# Altium footprint library Connectors THD.PcbLib: 631 footprints (part 7 of 46)
Each footprint in its own frame and in the unit in brackets; x right, y up, seen from the top. Pads: shape width x height; smd on the part's side, far side on the other; paste and mask are expansions set on the pad; w line width, h text height; cw(c..) or ccw(c..) is an arc to the next point about the centre after c.
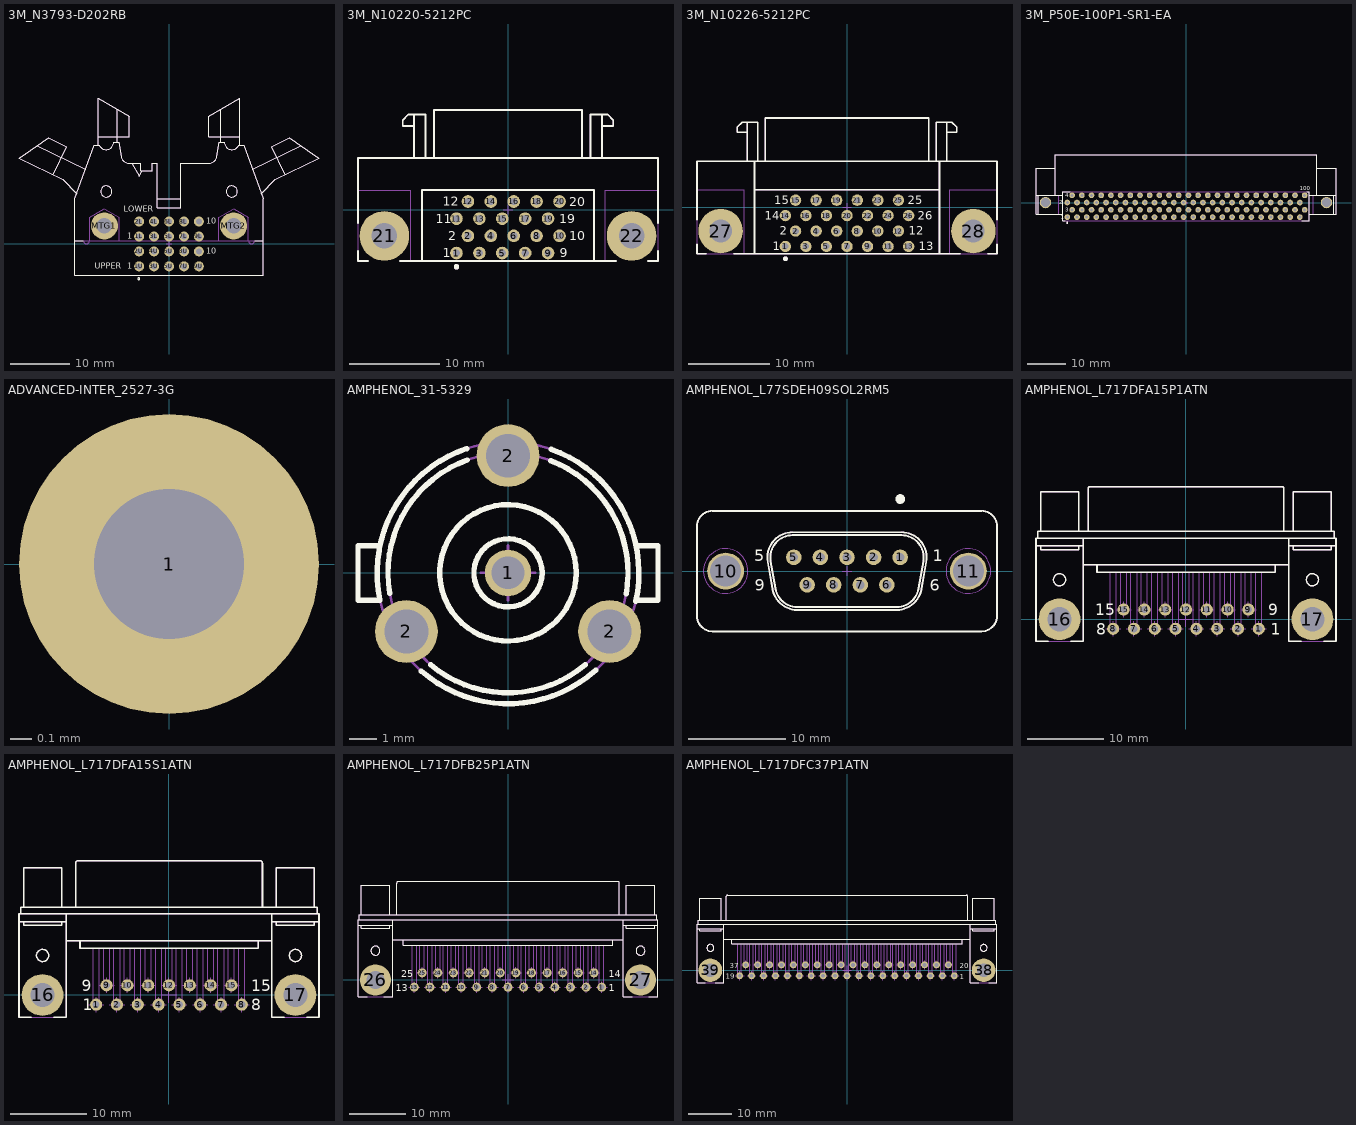
[diagram p6: the footprints below, top view; thin cyan lines are the x and y axes]

## 3M_N3793-D202RB [mm] "3M, 3000 Series, 2x10 Contacts - Pitch 2.54mm - Right Angle Four-Wall Condo Header (Black) With Short Roll Pin Latch/Ejectors"
height 15.5
pads (22):
  round 1.7 hole 1: 1L(-5.08,1.27) 1U(-5.08,-3.81) 2L(-5.08,3.81) 2U(-5.08,-1.27) 3L(-2.54,1.27) 3U(-2.54,-3.81) 4L(-2.54,3.81) 4U(-2.54,-1.27) 5L(0,1.27) 5U(0,-3.81) 6L(0,3.81) 6U(0,-1.27) 7L(2.54,1.27) 7U(2.54,-3.81) 8L(2.54,3.81) 8U(2.54,-1.27) 9L(5.08,1.27) 9U(5.08,-3.81) 10L(5.08,3.81) 10U(5.08,-1.27)
  round 4.6 hole 2.6: MTG1(-10.985,3.073) MTG2(10.985,3.073)
Top Overlay:
  circle w0.2: c-5.153,-5.913 r0.15
  circle w0.2: c10.668,8.915 r0.953
  circle w0.2: c-10.668,8.915 r0.953
  lines w0.2: -22.423,16.687 -14.159,12.71 ; -19.64,11.768 -17.36,16.505 -20.484,18.009 -25.5,14.588 -18.069,11.011 -15.671,8.554 ; -11.989,16.789 -11.989,24.74 -6.731,21.704 -6.731,18.237 -11.989,18.237 ; -8.763,17.297 -8.763,22.877 ; -6.829,13.741 -4.763,13.741 ; -6.318,13.741 -5.048,11.542 -4.511,12.471 ; -2.858,13.741 -2.032,13.741 ; -2.851,13.741 -2.851,12.471 -4.769,12.471 -4.769,13.741 -6.794,13.741 cw(c-6.829,15.053) -8.126,14.859 -8.556,17.297 -9.398,17.297 cw(c-10.668,17.297) -11.832,16.789 -12.674,16.789 -16.002,7.645 -16.002,-5.309 16.002,-5.309 16.002,7.645 12.674,16.789 11.832,16.789 cw(c10.668,17.297) 9.398,17.297 8.556,17.297 8.126,14.859 cw(c6.829,15.053) 6.794,13.741 2.032,13.741 ; 8.763,17.297 8.763,22.877 ; 11.989,16.789 11.989,24.74 6.731,21.704 6.731,18.237 11.989,18.237 ; 14.159,12.71 22.423,16.687 ; 15.671,8.554 18.069,11.011 25.5,14.588 20.484,18.009 17.36,16.505 19.64,11.768 ; -2.032,6.121 2.032,6.121 ; -2.032,6.121 -2.032,13.741 ; -2.032,6.121 -2.032,13.741 ; -2.032,6.121 2.032,6.121 ; 2.032,6.121 2.032,13.741 ; 2.032,6.121 2.032,13.741 ; -16.002,0.533 -14.542,0.533 -16.002,0.533 ; -2.032,7.645 2.032,7.645 -2.032,7.645 ; 14.542,0.533 16.002,0.533 14.542,0.533
  text "10" at 6.34,3.429 h1.02
  text "10" at 6.34,-1.651 h1.02
  text "UPPER" at -12.59,-4.25 h1
  text "1" at -7.112,-4.24 h1.02
  text "LOWER" at -7.685,5.465 h1
  text "1" at -7.112,0.84 h1.02
Mechanical 8:
  lines w0.1: -5.58,-3.81 -5.08,-3.81 ; -5.58,-1.27 -5.08,-1.27 ; -5.58,1.27 -5.08,1.27 ; -5.58,3.81 -5.08,3.81 ; -5.08,-4.31 -5.08,-3.81 ; -5.08,-3.31 -5.08,-3.81 ; -5.08,-1.77 -5.08,-1.27 ; -5.08,-0.77 -5.08,-1.27 ; -5.08,0.77 -5.08,1.27 ; -5.08,1.77 -5.08,1.27 ; -5.08,3.31 -5.08,3.81 ; -5.08,4.31 -5.08,3.81 ; -4.58,-3.81 -5.08,-3.81 ; -4.58,-1.27 -5.08,-1.27 ; -4.58,1.27 -5.08,1.27 ; -4.58,3.81 -5.08,3.81 ; -3.04,-3.81 -2.54,-3.81 ; -3.04,-1.27 -2.54,-1.27 ; -3.04,1.27 -2.54,1.27 ; -3.04,3.81 -2.54,3.81 ; -2.54,-4.31 -2.54,-3.81 ; -2.54,-3.31 -2.54,-3.81 ; -2.54,-1.77 -2.54,-1.27 ; -2.54,-0.77 -2.54,-1.27 ; -2.54,0.77 -2.54,1.27 ; -2.54,1.77 -2.54,1.27 ; -2.54,3.31 -2.54,3.81 ; -2.54,4.31 -2.54,3.81 ; -2.04,-3.81 -2.54,-3.81 ; -2.04,-1.27 -2.54,-1.27 ; -2.04,1.27 -2.54,1.27 ; -2.04,3.81 -2.54,3.81 ; -0.5,-3.81 0,-3.81 ; -0.5,-1.27 0,-1.27 ; -0.5,1.27 0,1.27 ; -0.5,3.81 0,3.81 ; 0,-4.31 0,-3.81 ; 0,-3.31 0,-3.81 ; 0,-1.77 0,-1.27 ; 0,-0.77 0,-1.27 ; 0,0.77 0,1.27 ; 0,1.77 0,1.27 ; 0,3.31 0,3.81 ; 0,4.31 0,3.81 ; 0.5,-3.81 0,-3.81 ; 0.5,-1.27 0,-1.27 ; 0.5,1.27 0,1.27 ; 0.5,3.81 0,3.81 ; 2.04,-3.81 2.54,-3.81 ; 2.04,-1.27 2.54,-1.27 ; 2.04,1.27 2.54,1.27 ; 2.04,3.81 2.54,3.81 ; 2.54,-4.31 2.54,-3.81 ; 2.54,-3.31 2.54,-3.81 ; 2.54,-1.77 2.54,-1.27 ; 2.54,-0.77 2.54,-1.27 ; 2.54,0.77 2.54,1.27 ; 2.54,1.77 2.54,1.27 ; 2.54,3.31 2.54,3.81 ; 2.54,4.31 2.54,3.81 ; 3.04,-3.81 2.54,-3.81 ; 3.04,-1.27 2.54,-1.27 ; 3.04,1.27 2.54,1.27 ; 3.04,3.81 2.54,3.81 ; 4.58,-3.81 5.08,-3.81 ; 4.58,-1.27 5.08,-1.27 ; 4.58,1.27 5.08,1.27 ; 4.58,3.81 5.08,3.81 ; 5.08,-4.31 5.08,-3.81 ; 5.08,-3.31 5.08,-3.81 ; 5.08,-1.77 5.08,-1.27 ; 5.08,-0.77 5.08,-1.27 ; 5.08,0.77 5.08,1.27 ; 5.08,1.77 5.08,1.27 ; 5.08,3.31 5.08,3.81 ; 5.08,4.31 5.08,3.81 ; 5.58,-3.81 5.08,-3.81 ; 5.58,-1.27 5.08,-1.27 ; 5.58,1.27 5.08,1.27 ; 5.58,3.81 5.08,3.81 ; 10.486,3.073 10.986,3.073 ; 10.986,2.573 10.986,3.073 ; 10.986,3.573 10.986,3.073 ; 11.486,3.073 10.986,3.073 ; 0,0 -0.5,0 0,0 ; 0,0 0,-0.5 0,0 ; 0,0 0.5,0 0,0 ; 0,0 0,0.5 0,0
Mechanical 14:
  circle w0.1: c10.668,8.915 r0.953
  circle w0.1: c-10.668,8.915 r0.953
  circle w0.1: c10.986,3.073 r1.27
  circle w0.1: c-10.986,3.073 r1.27
  lines w0.1: -22.423,16.687 -14.159,12.71 ; -19.64,11.768 -17.36,16.505 -20.484,18.009 -25.5,14.588 -18.069,11.011 -15.671,8.554 ; -11.989,16.789 -11.989,24.74 -6.731,21.704 -6.731,18.237 -11.989,18.237 ; -8.763,17.297 -8.763,22.877 ; -8.484,0.533 -8.484,4.518 -10.986,5.962 -13.487,4.518 -13.487,0.533 -13.526,0.533 cw(c-14.034,0.533) -14.542,0.533 -16.002,0.533 16.002,0.533 14.542,0.533 cw(c14.034,0.533) 13.526,0.533 13.487,0.533 13.487,4.518 10.986,5.962 8.484,4.518 8.484,0.533 ; -6.829,13.741 -4.763,13.741 ; -6.318,13.741 -5.048,11.542 -4.511,12.471 ; -2.858,13.741 -2.032,13.741 ; -2.851,13.741 -2.851,12.471 -4.769,12.471 -4.769,13.741 -6.794,13.741 cw(c-6.829,15.053) -8.126,14.859 -8.556,17.297 -9.398,17.297 cw(c-10.668,17.297) -11.832,16.789 -12.674,16.789 -16.002,7.645 -16.002,-5.309 16.002,-5.309 16.002,7.645 12.674,16.789 11.832,16.789 cw(c10.668,17.297) 9.398,17.297 8.556,17.297 8.126,14.859 cw(c6.829,15.053) 6.794,13.741 2.032,13.741 ; 8.763,17.297 8.763,22.877 ; 11.989,16.789 11.989,24.74 6.731,21.704 6.731,18.237 11.989,18.237 ; 14.159,12.71 22.423,16.687 ; 15.671,8.554 18.069,11.011 25.5,14.588 20.484,18.009 17.36,16.505 19.64,11.768 ; -2.032,6.121 2.032,6.121 ; -2.032,6.121 -2.032,13.741 ; -2.032,6.121 -2.032,13.741 ; -2.032,6.121 2.032,6.121 ; 2.032,6.121 2.032,13.741 ; 2.032,6.121 2.032,13.741 ; -2.032,7.645 2.032,7.645 -2.032,7.645
  text "10" at 6.34,-1.651 h1.02
  text "10" at 6.34,3.429 h1.02
  text "UPPER" at -12.59,-4.25 h1
  text "1" at -7.112,-4.24 h1.02
  text "LOWER" at -7.685,5.465 h1
  text "1" at -7.112,0.84 h1.02
3D body: height 15.49, standoff -3.81, extent -25.398,-5.309 25.398,18.009

## 3M_N10220-5212PC [mm] "20 contacts, Mini D Ribbon (MDR), 102 Series, .050\" Boardmount Through-hole Right Angle Receptacle-Shielded"
height 9.4
pads (22):
  round 1.4 hole 0.8: 1(-5.715,-4.826) 2(-4.445,-2.921) 3(-3.175,-4.826) 4(-1.905,-2.921) 5(-0.635,-4.826) 6(0.635,-2.921) 7(1.905,-4.826) 8(3.175,-2.921) 9(4.445,-4.826) 10(5.715,-2.921) 11(-5.715,-1.016) 12(-4.445,0.889) 13(-3.175,-1.016) 14(-1.905,0.889) 15(-0.635,-1.016) 16(0.635,0.889) 17(1.905,-1.016) 18(3.175,0.889) 19(4.445,-1.016) 20(5.715,0.889)
  round 5.5 hole 2.8: 21(-13.716,-2.921) 22(13.716,-2.921)
Top Overlay:
  circle w0.3: c-5.715,-6.35 r0.15
  lines w0.2: -16.637,-4.578 -16.637,-5.715 -15.5,-5.715 ; -16.637,-1.5 -16.637,5.715 16.637,5.715 16.637,-1.5 ; -12,-5.715 12,-5.715 ; -10.414,5.715 -10.414,10.541 ; -10.414,9.271 -11.684,9.271 -11.684,9.906 -11.049,10.541 -10.414,10.541 ; -9.525,-5.715 -9.525,2.159 9.525,2.159 9.525,-5.715 ; -9.144,5.715 -9.144,10.541 -10.414,10.541 ; -8.212,5.715 -8.212,11.049 8.212,11.049 8.212,5.715 ; 9.144,5.715 9.144,10.541 10.414,10.541 ; 10.414,5.715 10.414,10.541 ; 10.414,9.271 11.684,9.271 11.684,9.906 11.049,10.541 10.414,10.541 ; 15.5,-5.715 16.637,-5.715 16.637,-4.578
  text "1" at -7.225,-5.31 h1.02
  text "2" at -6.605,-3.405 h1.02
  text "12" at -7.255,0.405 h1.02
  text "11" at -8.025,-1.5 h1.02
  text "19" at 5.705,-1.505 h1.02
  text "9" at 5.727,-5.293 h1.02
  text "10" at 6.8,-3.435 h1.02
  text "20" at 6.8,0.375 h1.02
Mechanical 8:
  lines w0.1: -14.216,-2.921 -13.716,-2.921 ; -13.716,-3.421 -13.716,-2.921 ; -13.716,-2.421 -13.716,-2.921 ; -13.216,-2.921 -13.716,-2.921 ; -6.215,-4.826 -5.715,-4.826 ; -6.215,-1.016 -5.715,-1.016 ; -5.715,-5.326 -5.715,-4.826 ; -5.715,-4.326 -5.715,-4.826 ; -5.215,-4.826 -5.715,-4.826 ; -5.215,-1.016 -5.715,-1.016 ; -4.945,-2.921 -4.445,-2.921 ; -4.945,0.889 -4.445,0.889 ; -4.445,-3.421 -4.445,-2.921 ; -4.445,-2.421 -4.445,-2.921 ; -4.445,0.389 -4.445,0.889 ; -4.445,1.389 -4.445,0.889 ; -3.945,-2.921 -4.445,-2.921 ; -3.945,0.889 -4.445,0.889 ; -3.675,-4.826 -3.175,-4.826 ; -3.675,-1.016 -3.175,-1.016 ; -3.175,-5.326 -3.175,-4.826 ; -3.175,-4.326 -3.175,-4.826 ; -2.675,-4.826 -3.175,-4.826 ; -2.675,-1.016 -3.175,-1.016 ; -2.405,-2.921 -1.905,-2.921 ; -2.405,0.889 -1.905,0.889 ; -1.905,-3.421 -1.905,-2.921 ; -1.905,-2.421 -1.905,-2.921 ; -1.905,0.389 -1.905,0.889 ; -1.905,1.389 -1.905,0.889 ; -1.405,-2.921 -1.905,-2.921 ; -1.405,0.889 -1.905,0.889 ; -1.135,-4.826 -0.635,-4.826 ; -1.135,-1.016 -0.635,-1.016 ; -0.635,-5.326 -0.635,-4.826 ; -0.635,-4.326 -0.635,-4.826 ; -0.5,0 0,0 ; -0.135,-4.826 -0.635,-4.826 ; -0.135,-1.016 -0.635,-1.016 ; 0.135,-2.921 0.635,-2.921 ; 0.135,0.889 0.635,0.889 ; 0.5,0 0,0 ; 0.635,-3.421 0.635,-2.921 ; 0.635,-2.421 0.635,-2.921 ; 0.635,0.389 0.635,0.889 ; 0.635,1.389 0.635,0.889 ; 1.135,-2.921 0.635,-2.921 ; 1.135,0.889 0.635,0.889 ; 1.405,-4.826 1.905,-4.826 ; 1.405,-1.016 1.905,-1.016 ; 1.905,-5.326 1.905,-4.826 ; 1.905,-4.326 1.905,-4.826 ; 2.405,-4.826 1.905,-4.826 ; 2.405,-1.016 1.905,-1.016 ; 2.675,-2.921 3.175,-2.921 ; 2.675,0.889 3.175,0.889 ; 3.175,-3.421 3.175,-2.921 ; 3.175,-2.421 3.175,-2.921 ; 3.175,0.389 3.175,0.889 ; 3.175,1.389 3.175,0.889 ; 3.675,-2.921 3.175,-2.921 ; 3.675,0.889 3.175,0.889 ; 3.945,-4.826 4.445,-4.826 ; 3.945,-1.016 4.445,-1.016 ; 4.445,-5.326 4.445,-4.826 ; 4.445,-4.326 4.445,-4.826 ; 4.945,-4.826 4.445,-4.826 ; 4.945,-1.016 4.445,-1.016 ; 5.215,-2.921 5.715,-2.921 ; 5.215,0.889 5.715,0.889 ; 5.715,-3.421 5.715,-2.921 ; 5.715,-2.421 5.715,-2.921 ; 5.715,0.389 5.715,0.889 ; 5.715,1.389 5.715,0.889 ; 6.215,-2.921 5.715,-2.921 ; 6.215,0.889 5.715,0.889 ; 13.216,-2.921 13.716,-2.921 ; 13.716,-3.421 13.716,-2.921 ; 13.716,-2.421 13.716,-2.921 ; 14.216,-2.921 13.716,-2.921 ; -5.715,-1.016 -5.715,-0.516 -5.715,-1.016 ; -5.715,-1.016 -5.715,-1.516 -5.715,-1.016 ; -3.175,-1.016 -3.175,-0.516 -3.175,-1.016 ; -3.175,-1.016 -3.175,-1.516 -3.175,-1.016 ; -0.635,-1.016 -0.635,-0.516 -0.635,-1.016 ; -0.635,-1.016 -0.635,-1.516 -0.635,-1.016 ; 0,0 0,0.5 0,0 ; 0,0 0,-0.5 0,0 ; 1.905,-1.016 1.905,-0.516 1.905,-1.016 ; 1.905,-1.016 1.905,-1.516 1.905,-1.016 ; 4.445,-1.016 4.445,-0.516 4.445,-1.016 ; 4.445,-1.016 4.445,-1.516 4.445,-1.016
Mechanical 14:
  circle w0.1: c-13.716,-2.921 r1.245
  circle w0.1: c13.716,-2.921 r1.245
  circle w0.3: c-5.715,-6.35 r0.15
  lines w0.1: -16.637,-5.715 -16.637,5.715 16.637,5.715 16.637,-5.715 ; -16.637,2.159 -10.795,2.159 -10.795,-5.715 ; -13.97,-4.139 -13.97,-5.099 -13.462,-5.099 -13.462,-4.139 ; -13.97,-1.703 -13.97,-0.743 -13.462,-0.743 -13.462,-1.703 ; -10.414,5.715 -10.414,10.541 ; -10.414,9.271 -11.684,9.271 -11.684,9.906 -11.049,10.541 -10.414,10.541 ; -9.525,-5.715 -9.525,2.159 9.525,2.159 9.525,-5.715 ; -9.144,5.715 -9.144,10.541 -10.414,10.541 ; -8.212,5.715 -8.212,11.049 8.212,11.049 8.212,5.715 ; 9.144,5.715 9.144,10.541 10.414,10.541 ; 10.414,5.715 10.414,10.541 ; 10.414,9.271 11.684,9.271 11.684,9.906 11.049,10.541 10.414,10.541 ; 10.795,-5.715 10.795,2.159 16.637,2.159 ; 13.462,-4.139 13.462,-5.099 13.97,-5.099 13.97,-4.139 ; 13.462,-1.703 13.462,-0.743 13.97,-0.743 13.97,-1.703
  text "1" at -7.225,-5.31 h1.02
  text "2" at -6.605,-3.405 h1.02
  text "12" at -7.255,0.405 h1.02
  text "11" at -8.025,-1.5 h1.02
  text "19" at 5.705,-1.505 h1.02
  text "9" at 5.727,-5.293 h1.02
  text "10" at 6.8,-3.435 h1.02
  text "20" at 6.8,0.375 h1.02
3D body: height 9.4, standoff -3.81, extent -16.637,-5.715 16.637,11.049

## 3M_N10226-5212PC [mm] "26 contacts, Mini D Ribbon (MDR), 102 Series, .050\" Boardmount Through-hole Right Angle Receptacle-Shielded"
height 9.4
pads (28):
  round 1.4 hole 0.8: 1(-7.62,-4.826) 2(-6.35,-2.921) 3(-5.08,-4.826) 4(-3.81,-2.921) 5(-2.54,-4.826) 6(-1.27,-2.921) 7(0,-4.826) 8(1.27,-2.921) 9(2.54,-4.826) 10(3.81,-2.921) 11(5.08,-4.826) 12(6.35,-2.921) 13(7.62,-4.826) 14(-7.62,-1.016) 15(-6.35,0.889) 16(-5.08,-1.016) 17(-3.81,0.889) 18(-2.54,-1.016) 19(-1.27,0.889) 20(0,-1.016) 21(1.27,0.889) 22(2.54,-1.016) 23(3.81,0.889) 24(5.08,-1.016) 25(6.35,0.889) 26(7.62,-1.016)
  round 5.5 hole 2.8: 27(-15.621,-2.921) 28(15.621,-2.921)
Top Overlay:
  circle w0.3: c-7.62,-6.35 r0.15
  lines w0.2: -18.542,-4.578 -18.542,-5.715 -17.405,-5.715 ; -18.542,-1.5 -18.542,5.715 18.542,5.715 18.542,-1.5 ; -14,-5.715 14,-5.715 ; -12.319,5.715 -12.319,10.541 ; -12.319,9.271 -13.589,9.271 -13.589,9.906 -12.954,10.541 -12.319,10.541 ; -11.43,-5.715 -11.43,5.715 ; -11.43,2.159 11.43,2.159 ; -11.049,5.715 -11.049,10.541 -12.319,10.541 ; -10.1,5.715 -10.1,11.049 10.1,11.049 10.1,5.715 ; 11.049,5.715 11.049,10.541 12.319,10.541 ; 11.43,-5.715 11.43,5.715 ; 12.319,5.715 12.319,10.541 ; 12.319,9.271 13.589,9.271 13.589,9.906 12.954,10.541 12.319,10.541 ; 17.405,-5.715 18.542,-5.715 18.542,-4.578
  text "1" at -9.19,-5.31 h1.02
  text "2" at -8.32,-3.405 h1.02
  text "15" at -9.02,0.405 h1.02
  text "14" at -10.14,-1.5 h1.02
  text "26" at 8.77,-1.505 h1.02
  text "13" at 8.895,-5.315 h1.02
  text "12" at 7.615,-3.41 h1.02
  text "25" at 7.49,0.4 h1.02
Mechanical 8:
  lines w0.1: -8.12,-4.826 -7.62,-4.826 ; -8.12,-1.016 -7.62,-1.016 ; -7.62,-5.326 -7.62,-4.826 ; -7.62,-4.326 -7.62,-4.826 ; -7.12,-4.826 -7.62,-4.826 ; -7.12,-1.016 -7.62,-1.016 ; -6.85,-2.921 -6.35,-2.921 ; -6.85,0.889 -6.35,0.889 ; -6.35,-3.421 -6.35,-2.921 ; -6.35,-2.421 -6.35,-2.921 ; -6.35,0.389 -6.35,0.889 ; -6.35,1.389 -6.35,0.889 ; -5.85,-2.921 -6.35,-2.921 ; -5.85,0.889 -6.35,0.889 ; -5.58,-4.826 -5.08,-4.826 ; -5.58,-1.016 -5.08,-1.016 ; -5.08,-5.326 -5.08,-4.826 ; -5.08,-4.326 -5.08,-4.826 ; -4.58,-4.826 -5.08,-4.826 ; -4.58,-1.016 -5.08,-1.016 ; -4.31,-2.921 -3.81,-2.921 ; -4.31,0.889 -3.81,0.889 ; -3.81,-3.421 -3.81,-2.921 ; -3.81,-2.421 -3.81,-2.921 ; -3.81,0.389 -3.81,0.889 ; -3.81,1.389 -3.81,0.889 ; -3.31,-2.921 -3.81,-2.921 ; -3.31,0.889 -3.81,0.889 ; -3.04,-4.826 -2.54,-4.826 ; -3.04,-1.016 -2.54,-1.016 ; -2.54,-5.326 -2.54,-4.826 ; -2.54,-4.326 -2.54,-4.826 ; -2.04,-4.826 -2.54,-4.826 ; -2.04,-1.016 -2.54,-1.016 ; -1.77,-2.921 -1.27,-2.921 ; -1.77,0.889 -1.27,0.889 ; -1.27,-3.421 -1.27,-2.921 ; -1.27,-2.421 -1.27,-2.921 ; -1.27,0.389 -1.27,0.889 ; -1.27,1.389 -1.27,0.889 ; -0.77,-2.921 -1.27,-2.921 ; -0.77,0.889 -1.27,0.889 ; -0.5,-4.826 0,-4.826 ; -0.5,-1.016 0,-1.016 ; -0.5,0 0,0 ; 0,-5.326 0,-4.826 ; 0,-4.326 0,-4.826 ; 0.5,-4.826 0,-4.826 ; 0.5,-1.016 0,-1.016 ; 0.5,0 0,0 ; 0.77,-2.921 1.27,-2.921 ; 0.77,0.889 1.27,0.889 ; 1.27,-3.421 1.27,-2.921 ; 1.27,-2.421 1.27,-2.921 ; 1.27,0.389 1.27,0.889 ; 1.27,1.389 1.27,0.889 ; 1.77,-2.921 1.27,-2.921 ; 1.77,0.889 1.27,0.889 ; 2.04,-4.826 2.54,-4.826 ; 2.04,-1.016 2.54,-1.016 ; 2.54,-5.326 2.54,-4.826 ; 2.54,-4.326 2.54,-4.826 ; 3.04,-4.826 2.54,-4.826 ; 3.04,-1.016 2.54,-1.016 ; 3.31,-2.921 3.81,-2.921 ; 3.31,0.889 3.81,0.889 ; 3.81,-3.421 3.81,-2.921 ; 3.81,-2.421 3.81,-2.921 ; 3.81,0.389 3.81,0.889 ; 3.81,1.389 3.81,0.889 ; 4.31,-2.921 3.81,-2.921 ; 4.31,0.889 3.81,0.889 ; 4.58,-4.826 5.08,-4.826 ; 4.58,-1.016 5.08,-1.016 ; 5.08,-5.326 5.08,-4.826 ; 5.08,-4.326 5.08,-4.826 ; 5.58,-4.826 5.08,-4.826 ; 5.58,-1.016 5.08,-1.016 ; 5.85,-2.921 6.35,-2.921 ; 5.85,0.889 6.35,0.889 ; 6.35,-3.421 6.35,-2.921 ; 6.35,-2.421 6.35,-2.921 ; 6.35,0.389 6.35,0.889 ; 6.35,1.389 6.35,0.889 ; 6.85,-2.921 6.35,-2.921 ; 6.85,0.889 6.35,0.889 ; 7.12,-4.826 7.62,-4.826 ; 7.12,-1.016 7.62,-1.016 ; 7.62,-5.326 7.62,-4.826 ; 7.62,-4.326 7.62,-4.826 ; 8.12,-4.826 7.62,-4.826 ; 8.12,-1.016 7.62,-1.016 ; 15.121,-2.921 15.621,-2.921 ; 15.621,-3.421 15.621,-2.921 ; 15.621,-2.421 15.621,-2.921 ; 16.121,-2.921 15.621,-2.921 ; -7.62,-1.016 -7.62,-1.516 -7.62,-1.016 ; -7.62,-1.016 -7.62,-0.516 -7.62,-1.016 ; -5.08,-1.016 -5.08,-1.516 -5.08,-1.016 ; -5.08,-1.016 -5.08,-0.516 -5.08,-1.016 ; -2.54,-1.016 -2.54,-1.516 -2.54,-1.016 ; -2.54,-1.016 -2.54,-0.516 -2.54,-1.016 ; 0,-1.016 0,-1.516 0,-1.016 ; 0,-1.016 0,-0.516 0,-1.016 ; 0,0 0,-0.5 0,0 ; 0,0 0,0.5 0,0 ; 2.54,-1.016 2.54,-1.516 2.54,-1.016 ; 2.54,-1.016 2.54,-0.516 2.54,-1.016 ; 5.08,-1.016 5.08,-1.516 5.08,-1.016 ; 5.08,-1.016 5.08,-0.516 5.08,-1.016 ; 7.62,-1.016 7.62,-1.516 7.62,-1.016 ; 7.62,-1.016 7.62,-0.516 7.62,-1.016
  lines w0.2: -16.121,-2.921 -15.621,-2.921 ; -15.621,-3.421 -15.621,-2.921 ; -15.621,-2.421 -15.621,-2.921 ; -15.121,-2.921 -15.621,-2.921
Mechanical 14:
  circle w0.1: c-15.621,-2.921 r1.245
  circle w0.1: c15.621,-2.921 r1.245
  circle w0.1: c15.621,-2.921 r1.245
  circle w0.3: c-7.62,-6.35 r0.15
  lines w0.1: -18.542,2.159 -12.7,2.159 -12.7,-5.715 ; -15.875,-4.139 -15.875,-5.099 -15.367,-5.099 -15.367,-4.139 ; -15.875,-1.703 -15.875,-0.743 -15.367,-0.743 -15.367,-1.703 ; -12.319,5.715 -12.319,10.541 ; -12.319,9.271 -13.589,9.271 -13.589,9.906 -12.954,10.541 -12.319,10.541 ; -11.43,-5.715 -11.43,5.715 ; -11.43,2.159 11.43,2.159 ; -11.049,5.715 -11.049,10.541 -12.319,10.541 ; -10.1,5.715 -10.1,11.049 10.1,11.049 10.1,5.715 ; 11.049,5.715 11.049,10.541 12.319,10.541 ; 11.43,-5.715 11.43,5.715 ; 12.319,5.715 12.319,10.541 ; 12.319,9.271 13.589,9.271 13.589,9.906 12.954,10.541 12.319,10.541 ; 12.7,-5.715 12.7,2.159 18.542,2.159 ; 15.367,-4.139 15.367,-5.099 15.875,-5.099 15.875,-4.139 ; 15.367,-1.703 15.367,-0.743 15.875,-0.743 15.875,-1.703 ; -18.542,-5.715 18.542,-5.715 18.542,5.715 -18.542,5.715 -18.542,-5.715
  text "1" at -9.19,-5.31 h1.02
  text "2" at -8.32,-3.405 h1.02
  text "15" at -9.02,0.405 h1.02
  text "14" at -10.14,-1.5 h1.02
  text "26" at 8.77,-1.505 h1.02
  text "13" at 8.895,-5.315 h1.02
  text "12" at 7.615,-3.41 h1.02
  text "25" at 7.49,0.4 h1.02
3D body: height 9.4, standoff -3.81, extent -18.542,-5.715 18.542,11.049

## 3M_P50E-100P1-SR1-EA [mm] "100 Contacts - .050\" Right Angle, Pak 50 Boardmount Plug, P50E Series"
height 7
pads (102):
  round 1.5 hole 0.8: 1(-31.115,-3.81) 2(-31.115,0) 3(-29.845,-1.905) 4(-29.845,1.905) 5(-28.575,-3.81) 6(-28.575,0) 7(-27.305,-1.905) 8(-27.305,1.905) 9(-26.035,-3.81) 10(-26.035,0) 11(-24.765,-1.905) 12(-24.765,1.905) 13(-23.495,-3.81) 14(-23.495,0) 15(-22.225,-1.905) 16(-22.225,1.905) 17(-20.955,-3.81) 18(-20.955,0) 19(-19.685,-1.905) 20(-19.685,1.905) 21(-18.415,-3.81) 22(-18.415,0) 23(-17.145,-1.905) 24(-17.145,1.905) 25(-15.875,-3.81) 26(-15.875,0) 27(-14.605,-1.905) 28(-14.605,1.905) 29(-13.335,-3.81) 30(-13.335,0) 31(-12.065,-1.905) 32(-12.065,1.905) 33(-10.795,-3.81) 34(-10.795,0) 35(-9.525,-1.905) 36(-9.525,1.905) 37(-8.255,-3.81) 38(-8.255,0) 39(-6.985,-1.905) 40(-6.985,1.905) 41(-5.715,-3.81) 42(-5.715,0) 43(-4.445,-1.905) 44(-4.445,1.905) 45(-3.175,-3.81) 46(-3.175,0) 47(-1.905,-1.905) 48(-1.905,1.905) 49(-0.635,-3.81) 50(-0.635,0) 51(0.635,-1.905) 52(0.635,1.905) 53(1.905,-3.81) 54(1.905,0) 55(3.175,-1.905) 56(3.175,1.905) 57(4.445,-3.81) 58(4.445,0) 59(5.715,-1.905) 60(5.715,1.905) 61(6.985,-3.81) 62(6.985,0) 63(8.255,-1.905) 64(8.255,1.905) 65(9.525,-3.81) 66(9.525,0) 67(10.795,-1.905) 68(10.795,1.905) 69(12.065,-3.81) 70(12.065,0) 71(13.335,-1.905) 72(13.335,1.905) 73(14.605,-3.81) 74(14.605,0) 75(15.875,-1.905) 76(15.875,1.905) 77(17.145,-3.81) 78(17.145,0) 79(18.415,-1.905) 80(18.415,1.905) 81(19.685,-3.81) 82(19.685,0) 83(20.955,-1.905) 84(20.955,1.905) 85(22.225,-3.81) 86(22.225,0) 87(23.495,-1.905) 88(23.495,1.905) 89(24.765,-3.81) 90(24.765,0) 91(26.035,-1.905) 92(26.035,1.905) 93(27.305,-3.81) 94(27.305,0) 95(28.575,-1.905) 96(28.575,1.905) 97(29.845,-3.81) 98(29.845,0) 99(31.115,-1.905) 100(31.115,1.905)
  round 3 hole 2.3: 101(-36.83,0) 102(36.83,0)
Top Overlay:
  circle w0.3: c-31.115,-5.334 r0.15
  lines w0.2: -39.319,1.906 -32.258,1.906 ; -38.71,-3.098 -38.71,1.906 ; -34.29,1.906 -34.29,12.6 34.29,12.6 34.29,1.906 ; -34.29,8.942 -39.319,8.942 -39.319,-3.098 -32.258,-3.098 ; -31.596,-4.799 -32.258,-4.799 -32.258,2.897 -30.321,2.897 ; 30.326,-4.799 32.258,-4.799 32.258,2.897 31.591,2.897 ; 32.258,-3.098 39.319,-3.098 39.319,8.942 34.29,8.942 ; 32.258,1.906 39.319,1.906 ; 38.71,-3.098 38.71,1.906
  text "1" at -32.863,-4.421 h1.02
  text "2" at -33.242,-0.484 h1.02
  text "100" at 29.799,3.199 h1.02
  text "4" at -31.669,1.421 h1.02
  text "3" at -31.669,-2.389 h1.02
Mechanical 8:
  drawing of 417 lines, arcs and shapes, not listed
Mechanical 14:
  circle w0.1: c-36.83,0 r1.156
  circle w0.1: c36.83,0 r1.156
  circle w0.3: c-31.115,-5.334 r0.15
  lines w0.1: -39.319,1.906 -32.258,1.906 ; -38.71,-3.098 -38.71,1.906 ; -34.29,1.906 -34.29,12.6 34.29,12.6 34.29,1.906 ; -34.29,8.942 -39.319,8.942 -39.319,-3.098 -32.258,-3.098 ; -33.299,-3.098 -33.299,1.906 ; 32.258,-3.098 39.319,-3.098 39.319,8.942 34.29,8.942 ; 32.258,1.906 39.319,1.906 ; 33.299,-3.098 33.299,1.906 ; 38.71,-3.098 38.71,1.906 ; -32.258,-4.799 -32.258,2.897 32.258,2.897 32.258,-4.799 -32.258,-4.799
  text "1" at -32.863,-4.421 h1.02
  text "2" at -33.242,-0.484 h1.02
  text "100" at 29.799,3.199 h1.02
  text "4" at -31.669,1.421 h1.02
  text "3" at -31.669,-2.389 h1.02
3D body: height 7.01, standoff -3, extent -39.319,-4.799 39.319,12.6

## ADVANCED-INTER_2527-3G [mm] "Single Male/Male Board Stacking Male Terminal adapter"
height 5.34
pads (1):
  round 1.4 hole 0.7: 1(0,0)
Mechanical 14:
  circle w0.1: c0,0 r0.47
  circle w0.1: c0,0 r0.23
3D body: height 4.97, standoff -3.18, extent -0.47,-0.47 0.47,0.47
